# Altium footprint library RoBeast_PCB_Library.PcbLib: 71 footprints (part 2 of 5)
Each footprint in its own frame and in the unit in brackets; x right, y up, seen from the top. Pads: shape width x height; smd on the part's side, far side on the other; paste and mask are expansions set on the pad; w line width, h text height; cw(c..) or ccw(c..) is an arc to the next point about the centre after c.
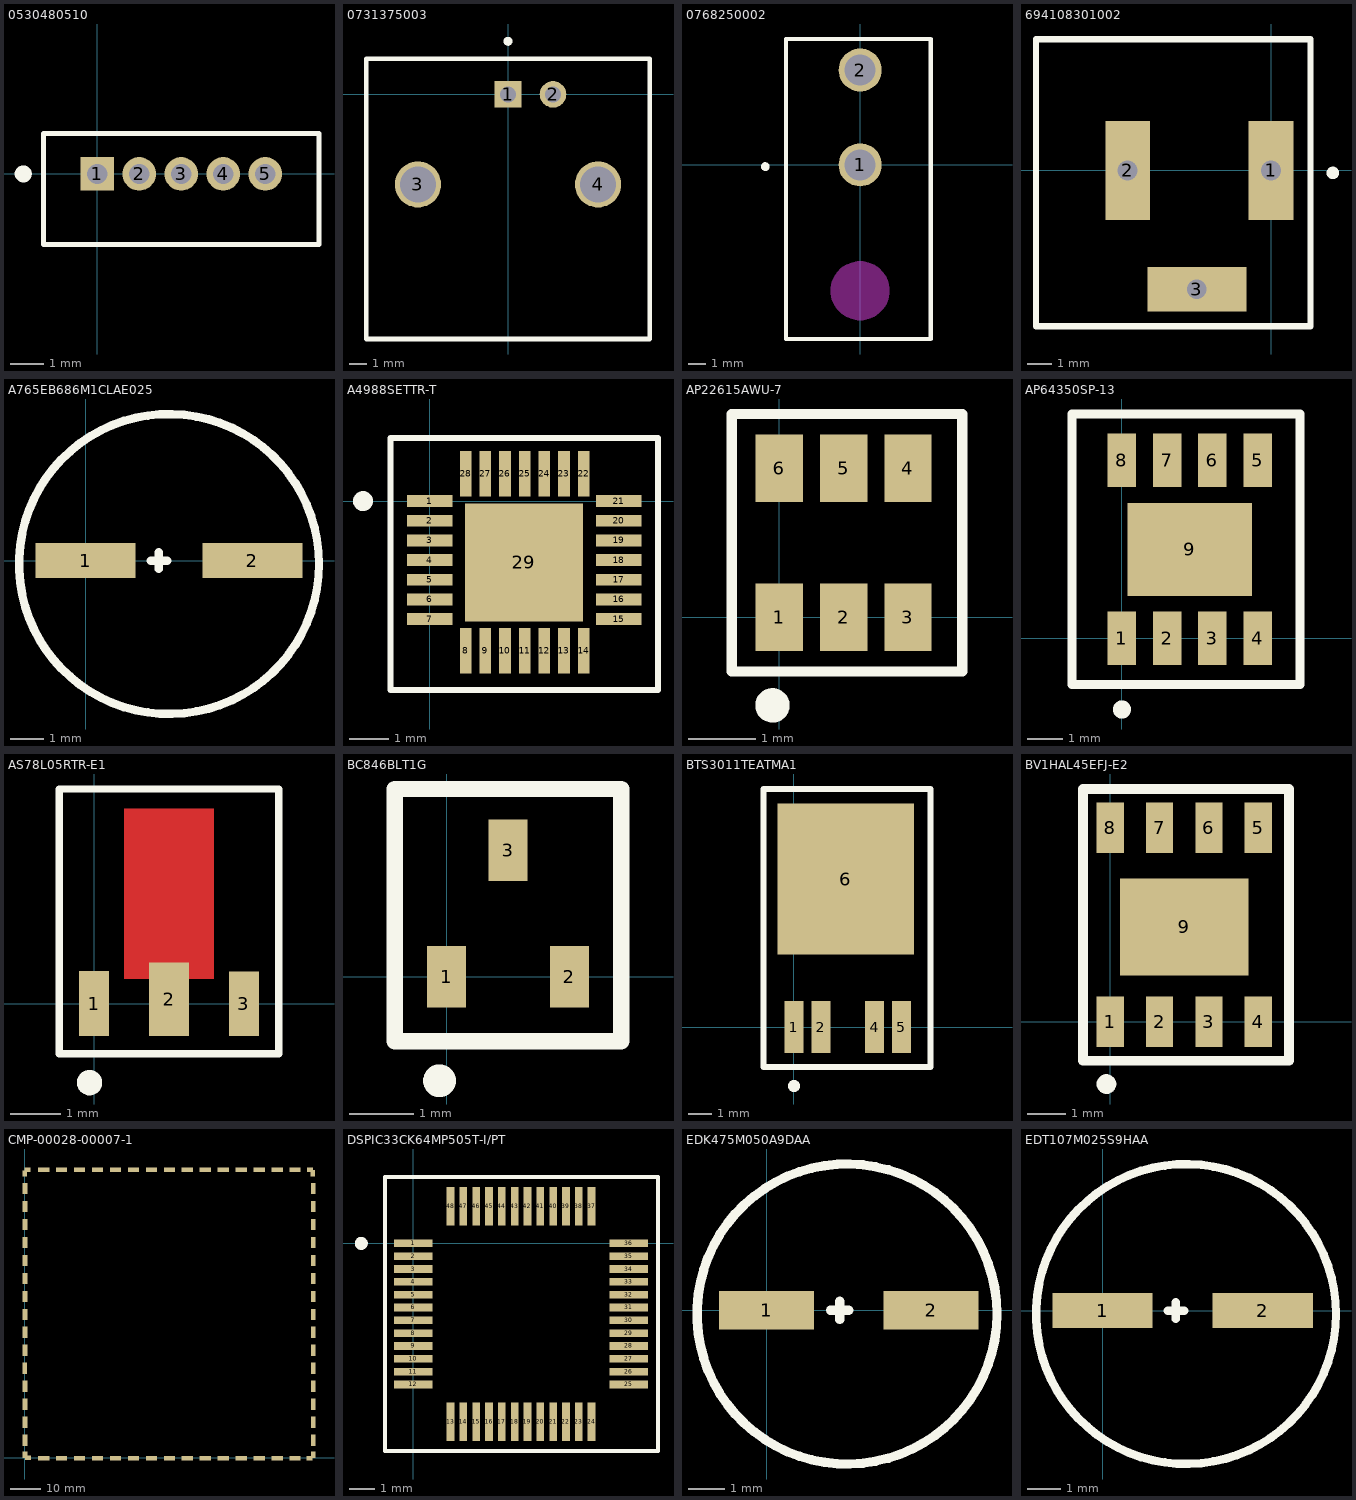
[diagram p1: the footprints below, top view; thin cyan lines are the x and y axes]

## 0530480510 [mm]
pads (5):
  rect 1x1 hole 0.6 mask+0.051: 1(0,0)
  round 1 hole 0.6 mask+0.051: 2(1.25,0) 3(2.5,0) 4(3.75,0) 5(5,0)
Top Overlay:
  circle w0.254: c-2.2,0 r0.127
  lines w0.15: -1.6,-2.1 -1.6,1.2 6.6,1.2 6.6,-2.1 -1.6,-2.1
3D body "530480510.step": height 3.6, standoff -2.2, extent -1.5,-4.4 6.5,1.1

## 0731375003 [mm]
pads (4):
  rect 1.5x1.5 hole 0.89 mask+0.051: 1(0,0)
  round 1.5 hole 0.89 mask+0.051: 2(2.54,0)
  round 2.6 hole 2.01 mask+0.051: 3(-5.08,-5.08) 4(5.08,-5.08)
Top Overlay:
  circle w0.254: c0,3 r0.127
  lines w0.254: -8,-13.8 -8,2 8,2 8,-13.8 -8,-13.8
3D body "0731375003--3DModel-STEP-56544.STEP": height 13.25, standoff -4.1, extent -7.338,-33.265 7.422,1.915

## 0768250002 [mm]
pads (2):
  round 2.5 hole 1.8: 1(0,0) 2(0,5.5)
Top Overlay:
  circle w0.254: c-5.5,-0.1 r0.127
  lines w0.254: -4.3,-10.1 -4.3,7.3 4.1,7.3 4.1,-10.1 -4.3,-10.1
Keep-Out Layer:
  board cut-out: 0,-9 -0.167,-9 -0.496,-8.935 -0.805,-8.807 -1.084,-8.62 -1.32,-8.384 -1.507,-8.105 -1.635,-7.796 -1.7,-7.467 -1.7,-7.3 -1.7,-7.133 -1.635,-6.804 -1.507,-6.495 -1.32,-6.216 -1.084,-5.98 -0.805,-5.793 -0.496,-5.665 -0.167,-5.6 0,-5.6 0.167,-5.6 0.496,-5.665 0.805,-5.793 1.084,-5.98 1.32,-6.216 1.507,-6.495 1.635,-6.804 1.7,-7.133 1.7,-7.3 1.7,-7.467 1.635,-7.796 1.507,-8.105 1.32,-8.384 1.084,-8.62 0.805,-8.807 0.496,-8.935 0.167,-9
3D body "768250002.stp": height 13.25, standoff -4.88, extent -4.249,-15.881 4.1,6.081

## 694108301002 [mm]
pads (3):
  rect 1.8x4 hole 0.8 square: 1(0,0) 2(-5.8,0)
  rect 4x1.8 hole 0.8 square: 3(-3,-4.8)
Top Overlay:
  circle w0.254: c2.5,-0.1 r0.127
  lines w0.254: -9.5,-6.3 1.6,-6.3 1.6,5.3 -9.5,5.3 -9.5,-6.3
3D body "694108301002 (rev1).stp": height 10.35, standoff -4.15, extent -13.6,-5 0.9,4.5

## A765EB686M1CLAE025 [mm]
pads (2):
  rect 3x1.05 smd: 1(0,0) 2(5,0)
Top Overlay:
  circle w0.254: c2.5,-0.1 r4.494
  lines w0.254: 1.95,0 2.45,0 ; 2.2,-0.25 2.2,0.25
3D body "A765EB686M1CLAE025.step": height 6, standoff 0, extent -1.25,-3.4 6.25,3.4

## A4988SETTR-T [mm]
pads (29):
  rect 1.15x0.3 smd mask+0.03: 1(0,0) 7(0,-3) 15(4.8,-3) 21(4.8,0)
  rect 1.15x0.3 smd mask+0.04: 2(0,-0.5) 3(0,-1) 4(0,-1.5) 5(0,-2) 6(0,-2.5) 16(4.8,-2.5) 17(4.8,-2) 18(4.8,-1.5) 19(4.8,-1) 20(4.8,-0.5)
  rect 0.3x1.15 smd mask+0.03: 8(0.91,-3.804) 14(3.91,-3.804) 22(3.91,0.696) 28(0.91,0.696)
  rect 0.3x1.15 smd mask+0.04: 9(1.41,-3.804) 10(1.91,-3.804) 11(2.41,-3.804) 12(2.91,-3.804) 13(3.41,-3.804) 23(3.41,0.696) 24(2.91,0.696) 25(2.41,0.696) 26(1.91,0.696) 27(1.41,0.696)
  rect 3x3 smd mask+0.03: 29(2.393,-1.557)
Top Overlay:
  circle w0.254: c-1.7,0 r0.127
  lines w0.15: -1,-4.8 -1,1.6 5.8,1.6 5.8,-4.8 -1,-4.8
3D body "QFN-28_ALM.step": height 0.92, standoff 0, extent -0.172,-4.109 4.984,1.047

## AP22615AWU-7 [mm]
pads (6):
  rect 0.7x1 smd mask+0.051: 1(0,0) 2(0.95,0) 3(1.9,0) 4(1.9,2.2) 5(0.95,2.2) 6(0,2.2)
Top Overlay:
  circle w0.254: c-0.1,-1.3 r0.127
  lines w0.15: -0.7,-0.8 2.7,-0.8 2.7,3 -0.7,3 -0.7,-0.8
3D body "TSOT26-P7_DIO.step": height 0.99, standoff 0, extent -0.529,-0.273 2.469,2.521

## AP64350SP-13 [mm]
pads (9):
  rect 0.802x1.505 smd: 1(0,0) 2(1.27,0) 3(2.54,0) 4(3.81,0) 5(3.81,4.995) 6(2.54,4.995) 7(1.27,4.995) 8(0,4.995)
  rect 3.502x2.613 smd: 9(1.905,2.498)
Top Overlay:
  circle w0.254: c0,-2 r0.127
  lines w0.254: -1.4,-1.3 -1.4,6.3 5,6.3 5,-1.3 -1.4,-1.3
3D body "SO-8EP_DIO.step": height 1.63, standoff -0.05, extent -0.576,-0.496 4.376,5.6

## AS78L05RTR-E1 [mm]
pads (3):
  rect 0.6x1.3 smd: 1(0,0) 3(3,0)
  rect 0.8x1.475 smd: 2(1.5,0.088)
Top Layer:
  region: 0.6,0.5 0.6,3.9 2.4,3.9 2.4,0.5
Top Overlay:
  circle w0.254: c-0.091,-1.581 r0.127
  lines w0.15: -0.7,-1 3.7,-1 3.7,4.3 -0.7,4.3 -0.7,-1
3D body "SOT89_B8D_DIO.step": height 1.65, standoff 0, extent -0.814,-0.524 3.784,3.845

## BC846BLT1G [mm]
pads (3):
  rect 0.6x0.95 smd: 1(0,0) 2(1.9,0) 3(0.95,1.95)
Top Overlay:
  circle w0.254: c-0.109,-1.609 r0.127
  lines w0.254: -0.8,-1 2.7,-1 2.7,2.9 -0.8,2.9 -0.8,-1
3D body "SOT-23_ONS.step": height 1.12, standoff 0, extent -0.585,-0.38 2.463,2.262

## BTS3011TEATMA1 [mm]
pads (5):
  rect 0.8x2.2 smd mask+0.051: 1(0,0) 2(1.14,0) 4(3.42,0) 5(4.56,0)
  rect 5.8x6.4 smd mask+0.051: 6(2.2,6.28)
Top Overlay:
  circle w0.254: c0,-2.5 r0.127
  lines w0.254: -1.3,-1.7 -1.3,10.1 5.8,10.1 5.8,-1.7 -1.3,-1.7
3D body "BTS6163DAUMA1.STEP": height 2.35, standoff 0, extent -1,-0.89 5.5,9.09

## BV1HAL45EFJ-E2 [mm]
pads (9):
  rect 0.7x1.3 smd mask+0.051: 1(0,0) 2(1.27,0) 3(2.54,0) 4(3.81,0) 5(3.81,5) 6(2.54,5) 7(1.27,5) 8(0,5)
  rect 3.3x2.5 smd: 9(1.905,2.45)
Top Overlay:
  circle w0.254: c-0.1,-1.6 r0.127
  lines w0.254: -0.7,-1 -0.7,6 4.6,6 4.6,-1 -0.7,-1
3D body "HTSOP-J8_ROM.step": height 0.99, standoff 0, extent -0.602,-0.599 4.402,5.599

## CMP-00028-00007-1 [mil]
pads (68):
  rect 60x80 smd: 1(0,40) 18(-5,3730) 36(3775,3735) 52(3785,40)
  rect 80x60 smd: 2(40,0) 19(35,3780) 35(3740,3780) 53(3735,-5)
  rect 60x147.5 smd: 3(0,230) 4(0,466.07) 5(0,702.14) 6(0.07,938.21) 7(-4.93,1174.29) 8(0,1410.36) 9(0,1646.43) 10(0,1882.5) 11(0,2118.57) 12(0,2354.64) 13(0,2590.71) 14(0,2826.79) 15(0,3062.86) 16(0,3298.93) 17(0,3535) 37(3785,3535) 38(3785,3298.93) 39(3785,3062.86) 40(3785,2826.79) 41(3785,2590.71) 42(3785,2354.64) 43(3785,2118.57) 44(3785,1882.5) 45(3785,1646.43) 46(3785,1410.36) 47(3785,1174.29) 48(3785,938.21) 49(3785,702.14) 50(3785,466.07) 51(3785,230)
  rect 147.5x60 smd: 20(245,3780) 21(480.71,3780) 22(716.43,3780) 23(952.14,3780) 24(1187.86,3780) 25(1423.57,3780) 26(1659.29,3780) 27(1895,3780) 28(2130.71,3780) 29(2366.43,3780) 30(2602.14,3780) 31(2837.86,3780) 32(3073.57,3780) 33(3309.28,3780) 34(3545,3780) 54(3545,-5) 55(3309.28,-5) 56(3073.57,-5) 57(2837.86,-5) 58(2602.14,-5) 59(2366.43,-5) 60(2130.71,-5) 61(1895,-5) 62(1659.29,-5) 63(1423.57,-5) 64(1187.86,-5) 65(952.14,-5) 66(716.43,-5) 67(480.71,-5) 68(245,-5)
3D body "SL-14351 REV P1.STEP": height 815, standoff 0, extent -29,-39 3809,3799

## DSPIC33CK64MP505T-I/PT [mm]
pads (48):
  rect 1.5x0.3 smd mask+0.049: 1(0,0) 2(0,-0.5) 3(0,-1) 4(0,-1.5) 5(0,-2) 6(0,-2.5) 7(0,-3) 8(0,-3.5) 9(0,-4) 10(0,-4.5) 11(0,-5) 12(0,-5.5) 25(8.4,-5.5) 26(8.4,-5) 27(8.4,-4.5) 28(8.4,-4) 29(8.4,-3.5) 30(8.4,-3) 31(8.4,-2.5) 32(8.4,-2) 33(8.4,-1.5) 34(8.4,-1) 35(8.4,-0.5) 36(8.4,0)
  rect 0.3x1.5 smd mask+0.049: 13(1.45,-6.95) 14(1.95,-6.95) 15(2.45,-6.95) 16(2.95,-6.95) 17(3.45,-6.95) 18(3.95,-6.95) 19(4.45,-6.95) 20(4.95,-6.95) 21(5.45,-6.95) 22(5.95,-6.95) 23(6.45,-6.95) 24(6.95,-6.95) 37(6.95,1.45) 38(6.45,1.45) 39(5.95,1.45) 40(5.45,1.45) 41(4.95,1.45) 42(4.45,1.45) 43(3.95,1.45) 44(3.45,1.45) 45(2.95,1.45) 46(2.45,1.45) 47(1.95,1.45) 48(1.45,1.45)
Top Overlay:
  circle w0.254: c-2.032,0 r0.127
  lines w0.15: -1.111,-8.1 -1.111,2.592 9.539,2.592 9.539,-8.1 -1.111,-8.1
3D body "TQFP48_PT_MCH.step": height 1.2, standoff 0, extent -0.296,-7.2 8.696,1.792

## EDK475M050A9DAA [mm]
pads (2):
  rect 2.6x1.05 smd: 1(0,0) 2(4.5,0)
Top Overlay:
  circle w0.254: c2.2,-0.1 r4.1
  lines w0.254: 1.75,0 2.25,0 ; 2,-0.25 2,0.25
3D body "EXV-9D_KEM.step": height 5.69, standoff 0, extent -0.975,-2.675 5.527,2.837

## EDT107M025S9HAA [mm]
pads (2):
  rect 3x1.05 smd: 1(0,0) 2(4.8,0)
Top Overlay:
  circle w0.254: c2.5,-0.1 r4.494
  lines w0.254: 1.95,0 2.45,0 ; 2.2,-0.25 2.2,0.25
3D body "EDT107M025S9HAA.step": height 8.01, standoff 0, extent -1.4,-3.4 6.2,3.4